# Altium footprint library SILICA_PCBLIB.PcbLib: 161 footprints (part 8 of 11)
Each footprint in its own frame and in the unit in brackets; x right, y up, seen from the top. Pads: shape width x height; smd on the part's side, far side on the other; paste and mask are expansions set on the pad; w line width, h text height; cw(c..) or ccw(c..) is an arc to the next point about the centre after c.
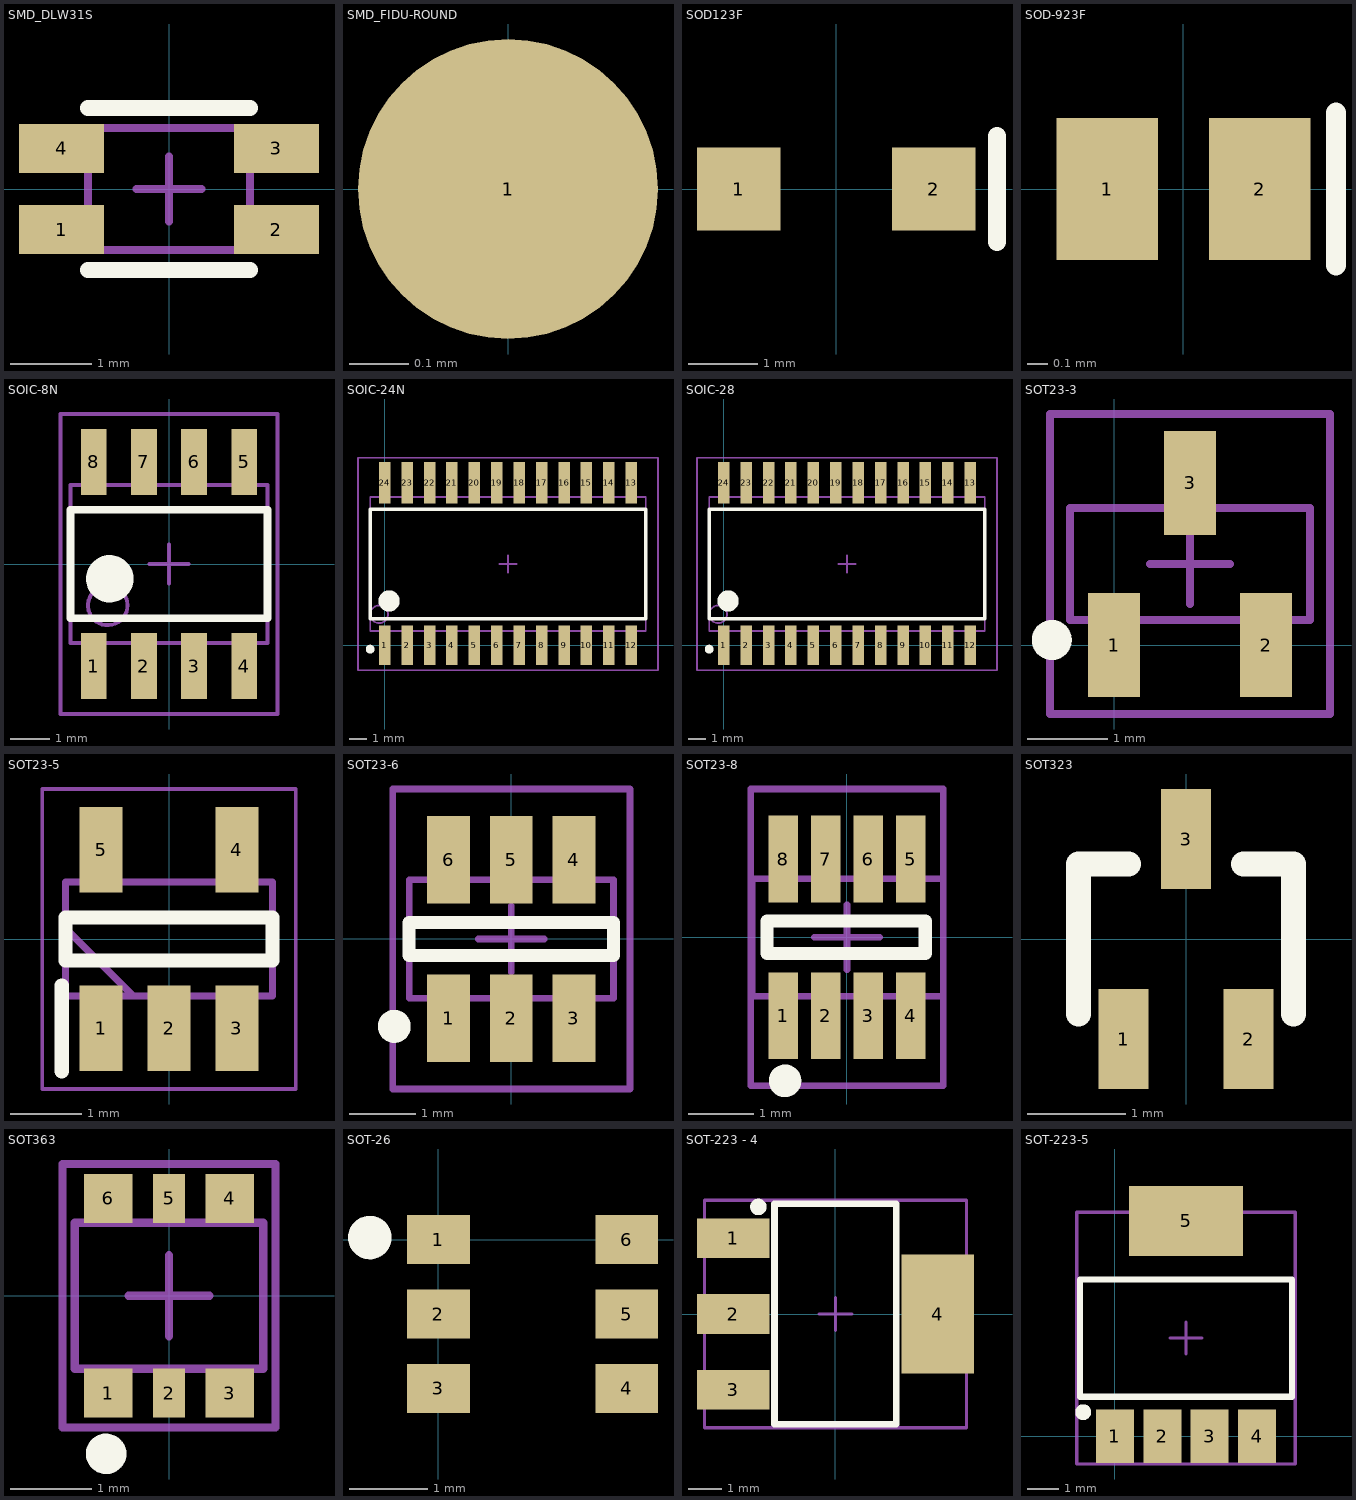
[diagram p7: the footprints below, top view; thin cyan lines are the x and y axes]

## SMD_DLW31S [mm] "DLW31S Series"
height 1.4
pads (4):
  rect 1.05x0.6 smd: 1(-1.325,-0.5) 2(1.325,-0.5) 3(1.325,0.5) 4(-1.325,0.5)
Top Overlay:
  lines w0.2: -1,-1 1,-1 ; -1,1 1,1
Mechanical 15:
  lines w0.1: -0.4,0 0.4,0 ; 0,-0.4 0,0.4 ; -1,-0.75 -1,0.75 1,0.75 1,-0.75 -1,-0.75
3D body "User Library-Common Mode Choke.STEP": height 1.99, standoff 0, extent -1.604,-0.807 1.604,0.807

## SMD_FIDU-ROUND [mil]
pads (1):
  round 20 smd paste-20 mask+4: 1(0,0)

## SOD123F [mm]
pads (2):
  rect 1.2x1.2 smd: 1(-1.4,0) 2(1.4,0)
Top Overlay:
  lines w0.254: 2.311,-0.762 2.311,0.762
3D body "User Library-SOD123F.STEP": height 1.2, standoff -0.01, extent -1.85,-0.85 1.9,0.85

## SOD-923F [mm]
pads (2):
  rect 0.5x0.7 smd: 1(-0.375,0) 2(0.375,0)
Top Overlay:
  lines w0.1: 0.75,-0.375 0.75,0.375
3D body: height 0.55, standoff 0, extent -0.625,-0.35 0.625,0.35

## SOIC-8N [mm]
height 1.75
pads (8):
  rect 0.65x1.675 smd paste-0.051 mask+0: 1(-1.905,-2.588) 2(-0.635,-2.588) 3(0.635,-2.588) 4(1.905,-2.588) 5(1.905,2.588) 6(0.635,2.588) 7(-0.635,2.588) 8(-1.905,2.588)
Top Overlay:
  circle w0.6: c-1.5,-0.375 r0.3
  lines w0.2: -2.5,-1.375 -2.5,1.375 2.5,1.375 2.5,-1.375 -2.5,-1.375
Mechanical 13:
  circle w0.1: c-1.55,-1.05 r0.5
  lines w0.1: -2.5,-2 -2.5,2 2.5,2 2.5,-2 -2.5,-2
Mechanical 15:
  lines w0.1: -0.5,0 0.5,0 ; 0,-0.5 0,0.5 ; -2.75,-3.8 -2.75,3.8 2.75,3.8 2.75,-3.8 -2.75,-3.8
3D body "User Library-SOIC-8.STEP": height 1.75, standoff 0, extent -2.5,-3.006 2.5,3.006

## SOIC-24N [mm] "SOIC, 24-Leads, Body 16,5x7,6mm (max), Pitch 1,27mm, IPC Medium Density"
height 2.65
pads (24):
  rect 0.65x2.25 smd paste-0.051 mask+0: 1(0,0) 2(1.27,0) 3(2.54,0) 4(3.81,0) 5(5.08,0) 6(6.35,0) 7(7.62,0) 8(8.89,0) 9(10.16,0) 10(11.43,0) 11(12.7,0) 12(13.97,0)
  rect 0.65x2.35 smd paste-0.051 mask+0: 13(13.97,9.2) 14(12.7,9.2) 15(11.43,9.2) 16(10.16,9.2) 17(8.89,9.2) 18(7.62,9.2) 19(6.35,9.2) 20(5.08,9.2) 21(3.81,9.2) 22(2.54,9.2) 23(1.27,9.2) 24(0,9.2)
Top Overlay:
  circle w0.6: c0.243,2.506 r0.3
  circle w0.25: c-0.825,-0.225 r0.125
  lines w0.2: -0.815,1.5 -0.815,7.7 14.785,7.7 14.785,1.5 -0.815,1.5
Mechanical 13:
  circle w0.1: c-0.315,1.75 r0.5
  lines w0.1: -0.815,0.8 -0.815,8.4 14.785,8.4 14.785,0.8 -0.815,0.8
Mechanical 15:
  lines w0.1: 6.485,4.6 7.485,4.6 ; 6.985,4.1 6.985,5.1 ; -1.515,-1.425 -1.515,10.625 15.485,10.625 15.485,-1.425 -1.515,-1.425
3D body "User Library-SOIC-24-300.STEP": height 2.67, standoff 0.07, extent -0.815,-0.7 14.785,9.9

## SOIC-28 [mm] "SOIC, 24-Leads, Body 16,5x7,6mm (max), Pitch 1,27mm, IPC Medium Density"
height 2.65
pads (24):
  rect 0.65x2.25 smd paste-0.051 mask+0: 1(0,0) 2(1.27,0) 3(2.54,0) 4(3.81,0) 5(5.08,0) 6(6.35,0) 7(7.62,0) 8(8.89,0) 9(10.16,0) 10(11.43,0) 11(12.7,0) 12(13.97,0)
  rect 0.65x2.35 smd paste-0.051 mask+0: 13(13.97,9.2) 14(12.7,9.2) 15(11.43,9.2) 16(10.16,9.2) 17(8.89,9.2) 18(7.62,9.2) 19(6.35,9.2) 20(5.08,9.2) 21(3.81,9.2) 22(2.54,9.2) 23(1.27,9.2) 24(0,9.2)
Top Overlay:
  circle w0.25: c-0.825,-0.225 r0.125
  circle w0.6: c0.243,2.506 r0.3
  lines w0.2: -0.815,1.5 14.785,1.5 14.785,7.7 -0.815,7.7 -0.815,1.5
Mechanical 13:
  circle w0.1: c-0.315,1.75 r0.5
  lines w0.1: -0.815,0.8 14.785,0.8 14.785,8.4 -0.815,8.4 -0.815,0.8
Mechanical 15:
  lines w0.1: 6.485,4.6 7.485,4.6 ; 6.985,4.1 6.985,5.1 ; -1.515,-1.425 15.485,-1.425 15.485,10.625 -1.515,10.625 -1.515,-1.425
3D body "User Library-SOIC-24-300.STEP": height 2.67, standoff 0.07, extent -0.815,-0.7 14.785,9.9

## SOT23-3 [mm] "SOT23, 3-Leads, Body 3,0x2,5mm (max), Pitch 0,83mm, IPC Medium Density"
height 1.1
pads (3):
  rect 0.65x1.3 smd paste-0.051 mask+0: 1(0,0) 2(1.9,0) 3(0.95,2.03)
Top Overlay:
  circle w0.25: c-0.78,0.065 r0.125
Mechanical 13:
  lines w0.1: -0.55,0.315 -0.55,1.715 2.45,1.715 2.45,0.315 -0.55,0.315
Mechanical 15:
  lines w0.1: 0.45,1.015 1.45,1.015 ; 0.95,0.515 0.95,1.515 ; -0.8,-0.86 -0.8,2.89 2.7,2.89 2.7,-0.86 -0.8,-0.86
3D body "User Library-sot23-1.STEP": height 1, standoff 0, extent -0.51,-0.155 2.41,2.185

## SOT23-5 [mm]
height 1.45
pads (5):
  rect 0.6x1.2 smd: 1(-0.95,-1.25) 2(0,-1.25) 3(0.95,-1.25) 4(0.95,1.25) 5(-0.95,1.25)
Top Overlay:
  lines w0.2: -1.5,-1.85 -1.5,-0.65 ; -1.45,-0.3 -1.45,0.3 1.45,0.3 1.45,-0.3 -1.45,-0.3
Mechanical 13:
  lines w0.1: -1.45,0.15 -0.5,-0.8 ; -1.45,-0.8 -1.45,0.8 1.45,0.8 1.45,-0.8 -1.45,-0.8
Mechanical 15:
  lines w0.05: -1.775,-2.1 -1.775,2.1 1.775,2.1 1.775,-2.1 -1.775,-2.1
3D body "TLV2241IDBVT.stp": height 1.45, standoff 0, extent -1.45,-1.4 1.45,1.4

## SOT23-6 [mm]
height 1.45
pads (6):
  rect 0.65x1.33 smd paste-0.051 mask+0: 1(-0.95,-1.2) 2(0,-1.2) 3(0.95,-1.2) 4(0.95,1.2) 5(0,1.2) 6(-0.95,1.2)
Top Overlay:
  circle w0.25: c-1.775,-1.325 r0.125
  lines w0.2: -1.55,-0.25 -1.55,0.25 1.55,0.25 1.55,-0.25 -1.55,-0.25
Mechanical 13:
  lines w0.1: -1.55,-0.9 1.55,-0.9 1.55,0.9 -1.55,0.9 -1.55,-0.9
Mechanical 15:
  lines w0.1: -0.5,0 0.5,0 ; 0,-0.5 0,0.5 ; -1.8,-2.275 1.8,-2.275 1.8,2.275 -1.8,2.275 -1.8,-2.275
3D body "User Library-SOT-23-6.step": height 1.3, standoff 0, extent -1.509,-1.505 1.491,1.495

## SOT23-8 [mm]
height 1.45
pads (8):
  rect 0.45x1.33 smd paste-0.051 mask+0: 1(-0.975,-1.2) 2(-0.325,-1.2) 3(0.325,-1.2) 4(0.975,-1.2) 5(0.975,1.2) 6(0.325,1.2) 7(-0.325,1.2) 8(-0.975,1.2)
Top Overlay:
  circle w0.25: c-0.95,-2.2 r0.125
  lines w0.2: -1.225,-0.25 -1.225,0.25 1.2,0.25 1.2,-0.25 -1.225,-0.25
Mechanical 13:
  lines w0.1: -1.45,-0.9 1.475,-0.9 1.475,0.9 -1.45,0.9 -1.45,-0.9
Mechanical 15:
  lines w0.1: -0.5,0 0.5,0 ; 0,-0.5 0,0.5 ; -1.475,-2.275 1.475,-2.275 1.475,2.275 -1.475,2.275 -1.475,-2.275
3D body "User Library-sot238.STEP": height 1.2, standoff 0, extent -1.457,-1.412 1.483,1.388

## SOT323 [mil]
pads (3):
  rect 20x40 smd: 1(-25,-40) 2(25,-40) 3(0,40)
Top Overlay:
  lines w10: -43,-30 -43,30 -23,30 ; 23,30 43,30 43,-30
3D body "User Library-SOT323 (SC70-3)-1.STEP": height 43.31, standoff 0, extent -43.3,-45.19 43.31,43.2

## SOT363 [mm] "plastic, surface-mounted package; 6 leads; 0.65 mm pitch; 2 mm x 1.25 mm x 0.95 mm body"
height 1.1
pads (6):
  rect 0.6x0.6 smd paste-0.051 mask+0: 1(-0.75,-1.2) 3(0.75,-1.2) 4(0.75,1.2) 6(-0.75,1.2)
  rect 0.4x0.6 smd paste-0.051 mask+0: 2(0,-1.2) 5(0,1.2)
Top Overlay:
  circle w0.25: c-0.775,-1.95 r0.125
Mechanical 13:
  lines w0.1: -1.162,-0.9 1.162,-0.9 1.162,0.9 -1.162,0.9 -1.162,-0.9
Mechanical 15:
  lines w0.1: -0.5,0 0.5,0 ; 0,-0.5 0,0.5 ; -1.312,-1.625 1.312,-1.625 1.312,1.625 -1.312,1.625 -1.312,-1.625
3D body "User Library-sot363.STEP": height 1, standoff 0, extent -1.059,-1.155 1.041,1.145

## SOT-26 [mm]
pads (6):
  rect 0.8x0.63 smd: 1(0,0) 2(0,-0.95) 3(0,-1.9) 4(2.4,-1.9) 5(2.4,-0.95) 6(2.4,0)
Top Overlay:
  circle w0.254: c-0.875,0.025 r0.151
  circle w0.254: c-0.875,0.038 r0.04
3D body "User Library-TSOP-6.STEP": height 1, standoff 0, extent -0.137,-2.475 2.563,0.525

## SOT-223 - 4 [mm] "SOT223, 4-Leads, Body 6,7x7,3mm (max), Pitch 2,30mm, IPC High Density"
height 1.8
pads (4):
  rect 2.2x1.2 smd paste-0.051 mask+0: 1(-3.1,2.3) 2(-3.1,0) 3(-3.1,-2.3)
  rect 2.2x3.6 smd paste-0.051 mask+0: 4(3.1,0)
Top Overlay:
  circle w0.25: c-2.338,3.247 r0.125
  lines w0.2: -1.85,-3.35 1.85,-3.35 1.85,3.35 -1.85,3.35 -1.85,-3.35
Mechanical 13:
  lines w0.1: -1.85,-3.35 1.85,-3.35 1.85,3.35 -1.85,3.35 -1.85,-3.35
Mechanical 15:
  lines w0.1: -0.5,0 0.5,0 ; 0,-0.5 0,0.5 ; -3.975,-3.45 3.975,-3.45 3.975,3.45 -3.975,3.45 -3.975,-3.45
3D body "User Library-SOT-223-2.STEP": height 1.85, standoff -0.05, extent -3.577,-3.378 3.627,3.322

## SOT-223-5 [mm] "SOT223, 4-Leads, Body 6,7x7,3mm (max), Pitch 2,30mm, IPC High Density"
height 1.8
pads (5):
  rect 1.2x1.7 smd paste-0.051 mask+0: 1(0,0) 2(1.5,0) 3(3,0) 4(4.5,0)
  rect 3.6x2.2 smd paste-0.051 mask+0: 5(2.25,6.8)
Top Overlay:
  circle w0.25: c-0.997,0.762 r0.125
  lines w0.2: -1.1,1.25 -1.1,4.95 5.6,4.95 5.6,1.25 -1.1,1.25
Mechanical 13:
  lines w0.1: -1.1,1.25 -1.1,4.95 5.6,4.95 5.6,1.25 -1.1,1.25
Mechanical 15:
  lines w0.1: 1.75,3.1 2.75,3.1 ; 2.25,2.6 2.25,3.6 ; -1.2,-0.875 -1.2,7.075 5.7,7.075 5.7,-0.875 -1.2,-0.875
3D body "User Library-User Library-SOT-223-5.STEP": height 1.64, standoff -0.01, extent -1,-0.335 5.5,6.665